# Altium footprint library TeCrea-Misc.PCBLIB: 105 footprints (part 7 of 7)
Each footprint in its own frame and in the unit in brackets; x right, y up, seen from the top. Pads: shape width x height; smd on the part's side, far side on the other; paste and mask are expansions set on the pad; w line width, h text height; cw(c..) or ccw(c..) is an arc to the next point about the centre after c.
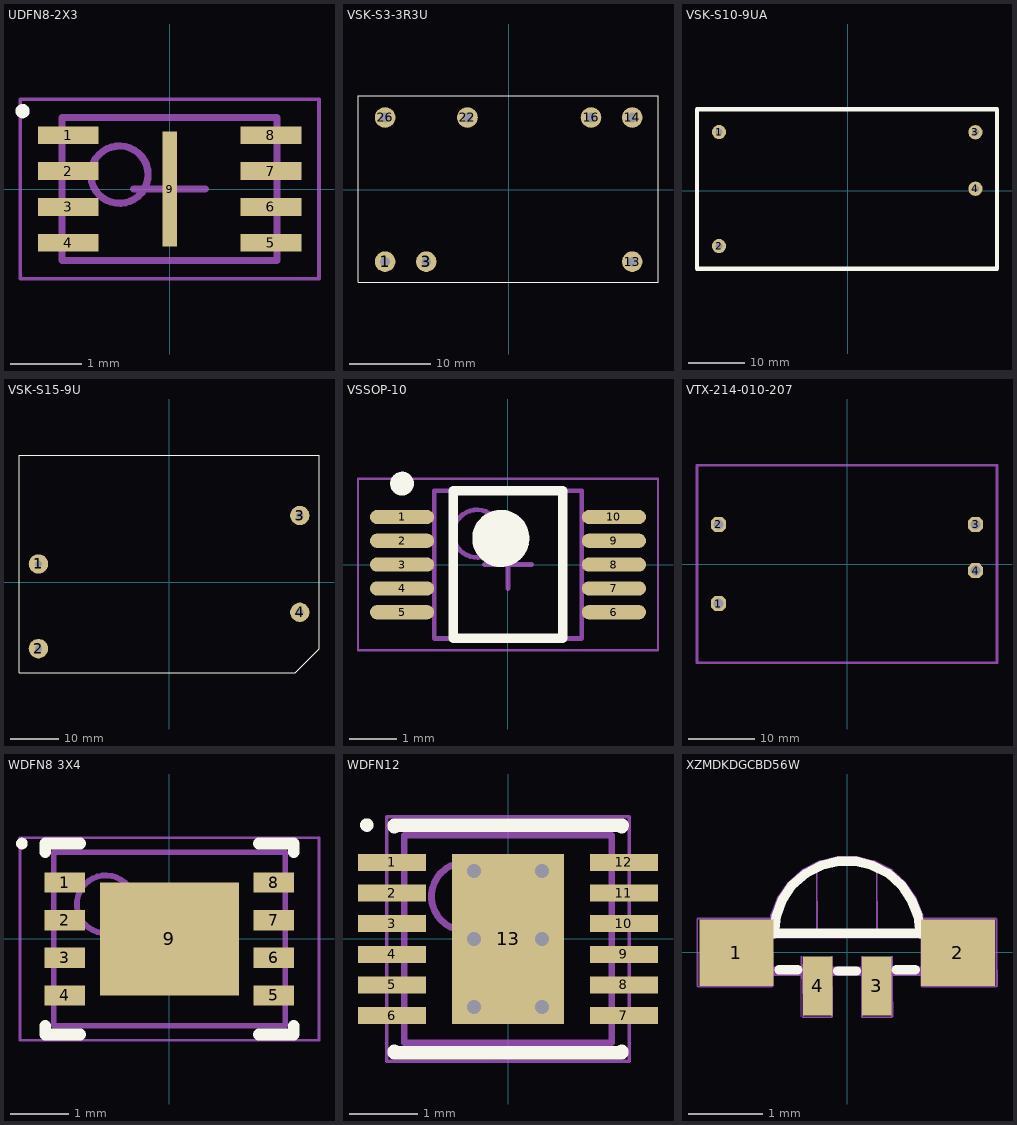
[diagram p6: the footprints below, top view; thin cyan lines are the x and y axes]

## UDFN8-2X3 [mm] "UDFN, 8-Leads, Body 2,00x3,00mm, Pitch 0,50mm, Thermal Pad 1,60x0,20mm, IPC Medium Density"
height 0.55
pads (9):
  rect 0.85x0.25 smd: 1(-1.415,0.75) 2(-1.415,0.25) 3(-1.415,-0.25) 4(-1.415,-0.75) 5(1.415,-0.75) 6(1.415,-0.25) 7(1.415,0.25) 8(1.415,0.75)
  rect 0.2x1.6 smd: 9(0,0)
Top Overlay:
  circle w0.1: c-2.052,1.087 r0.05
Mechanical 13:
  circle w0.1: c-0.7,0.2 r0.4
  lines w0.1: -1.5,-1 1.5,-1 1.5,1 -1.5,1 -1.5,-1
Mechanical 15:
  lines w0.05: -2.085,-1.25 2.085,-1.25 2.085,1.25 -2.085,1.25 -2.085,-1.25
  lines w0.1: -0.5,0 0.5,0 ; 0,-0.5 0,0.5
3D body "UDFN8-2X3.step": height 0.55, standoff 0, extent -1.52,-1 1.52,1

## VSK-S3-3R3U [mm]
pads (7):
  round 2.54 hole 1.2: 1(-15.24,-8.89) 3(-10.16,-8.89) 13(15.24,-8.89) 14(15.24,8.89) 16(10.16,8.89) 22(-5.08,8.89) 26(-15.24,8.89)
Top Overlay:
  lines w0.127: -18.58,-11.43 -18.58,11.57 18.42,11.57 18.42,-11.43 -18.58,-11.43
3D body "vsk-s3-3r3u.stp": height 15.1, standoff -4.1, extent -18.6,-11.4 18.4,11.6

## VSK-S10-9UA [mm]
pads (4):
  round 2.54 hole 1.2: 1(-22.95,10.5) 2(-22.95,-9.825) 3(22.75,10.475) 4(22.75,0.4)
Top Overlay:
  lines w0.8: -26.875,-13.9 -26.875,14.6 26.6,14.6 26.6,-13.9 -26.875,-13.9
3D body "vsk-s10-9ua.stp": height 19, standoff -6, extent -26.875,-13.9 26.625,14.6

## VSK-S15-9U [mm]
pads (4):
  round 4 hole 1.5: 1(-27,3.746) 2(-27,-13.754) 3(27,13.754) 4(27,-6.246)
Top Overlay:
  lines w0.1: -31.014,-18.768 -31.014,26.241 30.962,26.241 30.962,-13.815 26.035,-18.743 -31.014,-18.743 -31.014,-18.768
3D body "vsk-s15-9u.stp": height 22.51, standoff -5.99, extent -31.013,-18.754 30.987,26.246

## VSSOP-10 [mm] "TSSOP, 10-Leads, Body 3,00x3,00mm, Pitch 0,50mm, IPC Medium Density"
height 1.1
pads (10):
  oval 1.35x0.3 smd: 1(-2.225,1) 2(-2.225,0.5) 3(-2.225,0) 4(-2.225,-0.5) 5(-2.225,-1) 6(2.225,-1) 7(2.225,-0.5) 8(2.225,0) 9(2.225,0.5) 10(2.225,1)
Top Overlay:
  circle w0.6: c-0.15,0.55 r0.3
  circle w0.25: c-2.225,1.7 r0.125
  lines w0.2: -1.15,-1.55 1.15,-1.55 1.15,1.55 -1.15,1.55 -1.15,-1.55
Courtyard Top:
  lines w0.05: -3.15,-1.8 3.15,-1.8 3.15,1.8 -3.15,1.8 -3.15,-1.8
  lines w0.1: -0.5,0 0.5,0 ; 0,-0.5 0,0.5
Assembly Top:
  circle w0.1: c-0.65,0.65 r0.5
  lines w0.1: -1.55,-1.55 1.55,-1.55 1.55,1.55 -1.55,1.55 -1.55,-1.55
3D body "VSSOP-10.step": height 1.1, standoff 0, extent -2.45,-1.55 2.45,1.55

## VTX-214-010-207 [mm]
pads (4):
  oct 2.25x2.25 hole 1.5: 1(-19.5,-6) 2(-19.5,6) 3(19.5,6) 4(19.5,-1)
Mechanical 16:
  lines w0.406: -22.75,-15 22.75,-15 22.75,15 -22.75,15 -22.75,-15
3D body: height 24, standoff 0, extent -22.75,-15.025 22.725,15.026

## WDFN8 3X4 [mm] "SON, 8-Leads, Body 3,00x4,00mm, Pitch 0,65mm, Thermal Pad 1,80x2,40mm, IPC Medium Density"
height 0.8
pads (9):
  rect 0.7x0.35 smd: 1(-1.808,0.975) 2(-1.805,0.325) 3(-1.805,-0.325) 4(-1.805,-0.975) 5(1.805,-0.975) 6(1.805,-0.325) 7(1.805,0.325) 8(1.805,0.975)
  rect 2.4x1.96 smd: 9(0,0)
Top Overlay:
  circle w0.1: c-2.55,1.65 r0.05
  lines w0.2: -2.15,-1.5 -2.15,-1.65 -1.54,-1.65 ; -2.15,1.5 -2.15,1.65 -1.54,1.65 ; 1.54,-1.65 2.15,-1.65 2.15,-1.5 ; 1.54,1.65 2.15,1.65 2.15,1.5
Courtyard Top:
  lines w0.05: -2.585,-1.75 -2.585,1.75 2.585,1.75 2.585,-1.75 -2.585,-1.75
  lines w0.1: -0.5,0 0.5,0 ; 0,-0.5 0,0.5
Assembly Top:
  circle w0.1: c-1.1,0.6 r0.5
  lines w0.1: -2,-1.5 -2,1.5 2,1.5 2,-1.5 -2,-1.5
3D body "WDFN8 3X4.step": height 0.8, standoff 0, extent -2.05,-1.5 2.05,1.5

## WDFN12 [mm]
height 0.8
pads (13):
  rect 1x0.25 smd: 1(-1.705,1.125) 2(-1.705,0.675) 3(-1.705,0.225) 4(-1.705,-0.225) 5(-1.705,-0.675) 6(-1.705,-1.125) 7(1.705,-1.125) 8(1.705,-0.675) 9(1.705,-0.225) 10(1.705,0.225) 11(1.705,0.675) 12(1.705,1.125)
  rect 1.65x2.5 smd: 13(0,0)
via -0.5,1 diameter 0.5 hole 0.2
via 0.5,1 diameter 0.5 hole 0.2
via -0.5,0 diameter 0.5 hole 0.2
via 0.5,0 diameter 0.5 hole 0.2
via -0.5,-1 diameter 0.5 hole 0.2
via 0.5,-1 diameter 0.5 hole 0.2
Top Overlay:
  circle w0.1: c-2.075,1.675 r0.05
  lines w0.2: -1.675,-1.65 -1.675,-1.675 1.321,-1.675 ; -1.675,1.65 -1.675,1.675 1.676,1.675 ; 1.14,-1.675 1.675,-1.675 1.675,-1.65 ; 1.14,1.675 1.675,1.675 1.675,1.65
Mechanical 13:
  circle w0.1: c-0.625,0.625 r0.5
  lines w0.1: -1.525,-1.525 -1.525,1.525 1.525,1.525 1.525,-1.525 -1.525,-1.525
Mechanical 15:
  lines w0.05: -1.78,-1.8 -1.78,1.8 1.78,1.8 1.78,-1.8 -1.78,-1.8
  lines w0.1: -0.5,0 0.5,0 ; 0,-0.5 0,0.5
3D body "WDFN12.step": height 0.8, standoff 0, extent -1.526,-1.525 1.526,1.525

## XZMDKDGCBD56W [mm]
pads (4):
  rect 1x0.9 smd: 1(-1.499,-0.006) 2(1.501,-0.006)
  rect 0.4x0.8 smd: 3(0.401,-0.456) 4(-0.399,-0.456)
Top Overlay:
  lines w0.127: -0.987,0.25 -0.958,0.493 -0.88,0.707 -0.743,0.912 -0.559,1.067 -0.354,1.174 -0.12,1.233 0.123,1.233 0.347,1.174 0.561,1.067 0.736,0.912 0.872,0.707 0.96,0.493 0.989,0.25 ; -0.985,0.26 0.987,0.26 ; -0.922,-0.236 -0.667,-0.236 ; -0.127,-0.254 0.127,-0.254 ; 0.667,-0.236 0.924,-0.236
Mechanical 14:
  lines w0: -0.617,-0.872 -0.617,-0.056 -0.596,-0.872 ; -0.596,-0.056 -0.596,-0.872 ; -0.354,1.174 -0.354,1.184 ; -0.199,-0.056 -0.199,-0.872 ; -0.004,1.243 0.006,1.243 ; 0.208,-0.056 0.208,-0.872 ; 0.412,1.14 0.412,0.259 ; 0.616,-0.056 0.616,-0.872 ; -2.033,0.455 -2.033,-0.458 -2.022,-0.458 ; -2.033,0.455 -2.022,-0.458 ; -2.033,0.455 -2.022,0.455 ; -2.022,-0.469 -1.014,-0.469 -1.014,-0.458 ; -2.022,-0.469 -1.014,-0.458 ; -2.022,-0.469 -2.022,-0.458 ; -2.022,-0.458 -2.022,0.455 ; -2.022,-0.458 -1.014,-0.458 ; -2.022,0.455 -1.014,0.455 ; -2.022,0.455 -1.014,0.466 ; -2.022,0.455 -2.022,0.466 -1.014,0.466 ; -1.014,-0.458 -1.003,-0.458 ; -1.014,-0.458 -1.014,0.455 ; -1.014,0.455 -1.003,-0.458 ; -1.014,0.455 -1.003,0.455 -1.003,-0.458 ; -1.014,0.455 -1.014,0.466 ; -0.977,0.493 -0.89,0.717 ; -0.977,0.493 -0.958,0.493 ; -0.977,0.493 -1.006,0.25 -0.987,0.25 -0.958,0.493 ; -0.977,0.493 -0.977,0.493 ; -0.958,0.493 -0.88,0.707 ; -0.89,0.717 -0.753,0.912 ; -0.89,0.717 -0.88,0.707 ; -0.89,0.717 -0.88,0.707 ; -0.88,0.707 -0.743,0.912 ; -0.753,0.912 -0.568,1.077 ; -0.753,0.912 -0.743,0.912 ; -0.743,0.912 -0.559,1.067 -0.568,1.077 ; -0.596,-0.872 -0.199,-0.872 ; -0.568,1.077 -0.354,1.184 ; -0.568,1.077 -0.408,1.161 -0.12,1.233 ; -0.414,1.14 -0.414,0.259 -0.403,0.259 ; -0.414,1.14 -0.403,0.259 ; -0.414,1.14 -0.403,1.14 -0.403,0.259 ; -0.354,1.184 -0.12,1.243 ; -0.21,-0.056 -0.199,-0.872 ; -0.21,-0.056 -0.21,-0.872 -0.199,-0.872 ; -0.21,-0.056 -0.199,-0.872 ; -0.199,-0.872 -0.199,-0.883 -0.607,-0.883 -0.199,-0.872 ; -0.12,1.233 0.123,1.233 ; -0.12,1.233 -0.12,1.243 ; -0.12,1.243 0.123,1.243 ; 0.123,1.233 0.123,1.243 ; 0.123,1.233 0.347,1.174 ; 0.123,1.233 0.123,1.243 ; 0.123,1.243 0.357,1.184 ; 0.198,-0.883 0.605,-0.883 0.605,-0.872 ; 0.198,-0.883 0.605,-0.872 ; 0.198,-0.883 0.198,-0.872 ; 0.198,-0.872 0.208,-0.872 ; 0.198,-0.872 0.198,-0.056 0.208,-0.872 ; 0.208,-0.872 0.605,-0.872 ; 0.347,1.174 0.561,1.067 ; 0.347,1.174 0.357,1.184 ; 0.357,1.184 0.571,1.077 ; 0.412,0.259 0.401,0.259 0.401,1.14 0.412,0.259 ; 0.561,1.067 0.736,0.912 ; 0.561,1.067 0.571,1.077 ; 0.571,1.077 0.746,0.912 ; 0.605,-0.872 0.616,-0.872 ; 0.605,-0.872 0.605,-0.056 0.616,-0.872 ; 0.736,0.912 0.872,0.707 0.96,0.493 ; 0.736,0.912 0.746,0.912 ; 0.746,0.912 0.882,0.717 0.97,0.493 ; 0.96,0.493 0.989,0.25 0.999,0.25 0.97,0.493 ; 0.96,0.493 0.97,0.493 ; 1.002,0.455 1.002,-0.458 1.012,-0.458 ; 1.002,0.455 1.023,-0.458 ; 1.002,0.455 1.023,0.455 1.023,-0.458 ; 1.012,-0.469 2.02,-0.469 2.02,-0.458 ; 1.012,-0.469 2.02,-0.458 ; 1.012,-0.469 1.012,-0.458 ; 1.012,-0.458 1.023,-0.458 ; 1.012,0.455 2.02,0.455 ; 1.012,0.455 2.02,0.466 ; 1.012,0.455 1.012,0.466 2.02,0.466 ; 1.023,-0.458 2.02,-0.458 ; 1.495,-0.246 1.495,-0.256 -1.493,-0.256 -1.493,-0.236 1.495,-0.236 ; 1.495,-0.246 1.495,-0.236 ; 1.495,-0.246 1.486,-0.246 1.486,0.25 1.495,0.25 ; 1.495,-0.236 1.495,0.25 ; 1.495,0.25 -1.493,0.25 -1.493,0.26 1.495,0.26 1.495,0.25 ; 2.02,-0.458 2.031,-0.458 ; 2.02,-0.458 2.02,0.455 ; 2.02,0.455 2.031,-0.458 ; 2.02,0.455 2.031,0.455 2.031,-0.458 ; 2.02,0.455 2.02,0.466 ; -1.503,-0.246 -1.483,-0.246 -1.483,0.25 -1.503,0.25 -1.503,-0.246 ; -1.25,-0.246 -1.24,-0.246 -1.24,0.25 -1.25,0.25 -1.25,-0.246 ; 1.242,-0.246 1.252,-0.246 1.252,0.25 1.242,0.25 1.242,-0.246
Mechanical 16:
  lines w0.127: -1.493,-0.236 -1.493,-0.256 1.495,-0.256 1.495,-0.246 ; -1.493,0.26 -1.493,0.25 1.495,0.25 ; -0.987,0.25 -1.006,0.25 -0.977,0.493 ; -0.958,0.493 -0.977,0.493 ; -0.743,0.912 -0.753,0.912 ; -0.354,1.174 -0.354,1.184 ; -0.12,1.233 -0.12,1.243 ; -0.004,1.243 0.006,1.243 ; 0.347,1.174 0.357,1.184 ; 0.561,1.067 0.571,1.077 ; 0.736,0.912 0.746,0.912 ; 0.872,0.707 0.882,0.717 ; 0.96,0.493 0.97,0.493 ; 0.989,0.25 0.999,0.25 0.97,0.493 ; 1.495,0.26 1.495,0.25 ; -0.977,0.493 -0.89,0.717 ; -0.977,0.493 -0.977,0.493 ; -0.89,0.717 -0.753,0.912 ; -0.89,0.717 -0.88,0.707 -0.89,0.717 ; -0.753,0.912 -0.568,1.077 ; -0.568,1.077 -0.354,1.184 ; -0.568,1.077 -0.559,1.067 -0.568,1.077 ; -0.354,1.184 -0.12,1.243 ; -0.12,1.243 0.123,1.243 ; 0.123,1.243 0.357,1.184 ; 0.123,1.243 0.123,1.233 0.123,1.243 ; 0.357,1.184 0.571,1.077 ; 0.571,1.077 0.746,0.912 ; 0.746,0.912 0.882,0.717 ; 0.882,0.717 0.97,0.493 ; 1.495,-0.246 1.486,-0.246 1.486,0.25 1.495,0.25 ; 1.495,-0.246 1.495,0.25 ; -1.503,-0.246 -1.483,-0.246 -1.483,0.25 -1.503,0.25 -1.503,-0.246 ; -1.25,-0.246 -1.24,-0.246 -1.24,0.25 -1.25,0.25 -1.25,-0.246 ; 1.242,-0.246 1.252,-0.246 1.252,0.25 1.242,0.25 1.242,-0.246
3D body "XZxxxx56W.step": height 1.01, standoff 0.01, extent -1.246,-0.124 1.754,1.377